# Altium footprint library 常用芯片类.PcbLib: 3 footprints
Each footprint in its own frame and in the unit in brackets; x right, y up, seen from the top. Pads: shape width x height; smd on the part's side, far side on the other; paste and mask are expansions set on the pad; w line width, h text height; cw(c..) or ccw(c..) is an arc to the next point about the centre after c.
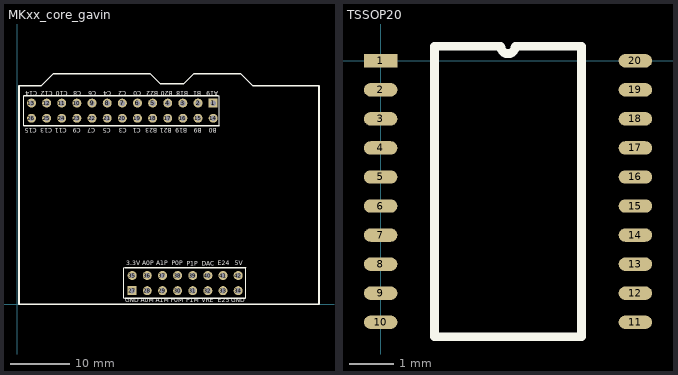
[diagram p0: the footprints below, top view; thin cyan lines are the x and y axes]

## MKxx_core_gavin [mm]
pads (42):
  rect 1.5x1.5 hole 0.9: 1(32.83,33.782) 27(19.241,2.311)
  round 1.5 hole 0.9: 2(30.29,33.782) 3(27.75,33.782) 4(25.21,33.782) 5(22.67,33.782) 6(20.13,33.782) 7(17.59,33.782) 8(15.05,33.782) 9(12.51,33.782) 10(9.97,33.782) 11(7.43,33.782) 12(4.89,33.782) 13(2.35,33.782) 14(32.83,31.242) 15(30.29,31.242) 16(27.75,31.242) 17(25.21,31.242) 18(22.67,31.242) 19(20.13,31.242) 20(17.59,31.242) 21(15.05,31.242) 22(12.51,31.242) 23(9.97,31.242) 24(7.43,31.242) 25(4.89,31.242) 26(2.35,31.242) 28(21.781,2.311) 29(24.321,2.311) 30(26.861,2.311) 31(29.401,2.311) 32(31.941,2.311) 33(34.481,2.311) 34(37.021,2.311) 35(19.241,4.851) 36(21.781,4.851) 37(24.321,4.851) 38(26.861,4.851) 39(29.401,4.851) 40(31.941,4.851) 41(34.481,4.851) 42(37.021,4.851)
Top Overlay:
  lines w0.2: 1.08,29.972 1.08,35.052 ; 17.844,1.041 17.844,6.121 ; 33.888,29.972 33.888,35.052 ; 38.291,1.041 38.291,6.121
  lines w0.254: 1.08,29.972 33.888,29.972 ; 1.08,35.052 33.694,35.052 ; 17.971,1.041 38.227,1.041 ; 17.971,6.121 38.291,6.121 ; 0.254,0 0.254,36.652 2.502,36.652 3.95,36.652 6.033,38.735 22.238,38.735 23.915,37.059 27.928,37.059 29.604,38.735 37.427,38.735 39.51,36.652 50.585,36.652 50.585,0 0.254,0
  text "5V" at 36.488,6.299 h1.27
  text "E24" at 33.567,6.325 h1.27
  text "DAC" at 30.874,6.274 h1.27
  text "P1P" at 28.436,6.274 h1.27
  text "P0P" at 25.896,6.299 h1.27
  text "A1P" at 23.254,6.299 h1.27
  text "A0P" at 20.917,6.299 h1.27
  text "3.3V" at 18.276,6.325 h1.27
  text "GND" at 18.098,0.127 h1.27
  text "A0M" at 20.663,0.102 h1.27
  text "A1M" at 23.203,0.127 h1.27
  text "P0M" at 25.743,0.102 h1.27
  text "P1M" at 28.334,0.102 h1.27
  text "VRE" at 30.874,0.127 h1.27
  text "E25" at 33.617,0.102 h1.27
  text "GND" at 35.853,0.127 h1.27
  text "C15" at 3.264,29.794 h1.27
  text "C13" at 5.83,29.794 h1.27
  text "C11" at 8.294,29.794 h1.27
  text "C9" at 10.63,29.794 h1.27
  text "C7" at 13.069,29.794 h1.27
  text "C5" at 15.685,29.794 h1.27
  text "C3" at 18.301,29.794 h1.27
  text "C1" at 20.714,29.794 h1.27
  text "B23" at 23.483,29.82 h1.27
  text "B21" at 25.896,29.82 h1.27
  text "B19" at 28.487,29.794 h1.27
  text "B9" at 30.9,29.794 h1.27
  text "B0" at 33.44,29.794 h1.27
  text "C14" at 3.341,36.043 h1.27
  text "C12" at 5.957,36.017 h1.27
  text "C10" at 8.421,36.017 h1.27
  text "C8" at 10.707,36.017 h1.27
  text "C6" at 13.221,36.017 h1.27
  text "C4" at 15.761,36.017 h1.27
  text "C2" at 18.276,36.017 h1.27
  text "C0" at 20.74,36.017 h1.27
  text "B22" at 23.61,36.017 h1.27
  text "B20" at 26.048,36.043 h1.27
  text "B18" at 28.664,36.043 h1.27
  text "B1" at 30.849,36.017 h1.27
  text "A19" at 33.719,36.017 h1.27

## PCBComponent_1 [mm]

## TSSOP20 [mm]
pads (20):
  rect 0.75x0.3 smd: 1(0,0)
  oval 0.75x0.3 smd: 2(0,-0.65) 3(0,-1.3) 4(0,-1.95) 5(0,-2.6) 6(0,-3.25) 7(0,-3.9) 8(0,-4.55) 9(0,-5.2) 10(0,-5.85) 11(5.7,-5.85) 12(5.7,-5.2) 13(5.7,-4.55) 14(5.7,-3.9) 15(5.7,-3.25) 16(5.7,-2.6) 17(5.7,-1.95) 18(5.7,-1.3) 19(5.7,-0.65) 20(5.7,0)
Top Overlay:
  lines w0.2: 1.21,-6.175 1.21,0.325 2.688,0.325 ccw(c2.85,0.325) 3.012,0.325 4.49,0.325 4.49,-6.175 1.21,-6.175